# Altium footprint library iMag.PcbLib: 52 footprints (part 1 of 4)
Each footprint in its own frame and in the unit in brackets; x right, y up, seen from the top. Pads: shape width x height; smd on the part's side, far side on the other; paste and mask are expansions set on the pad; w line width, h text height; cw(c..) or ccw(c..) is an arc to the next point about the centre after c.
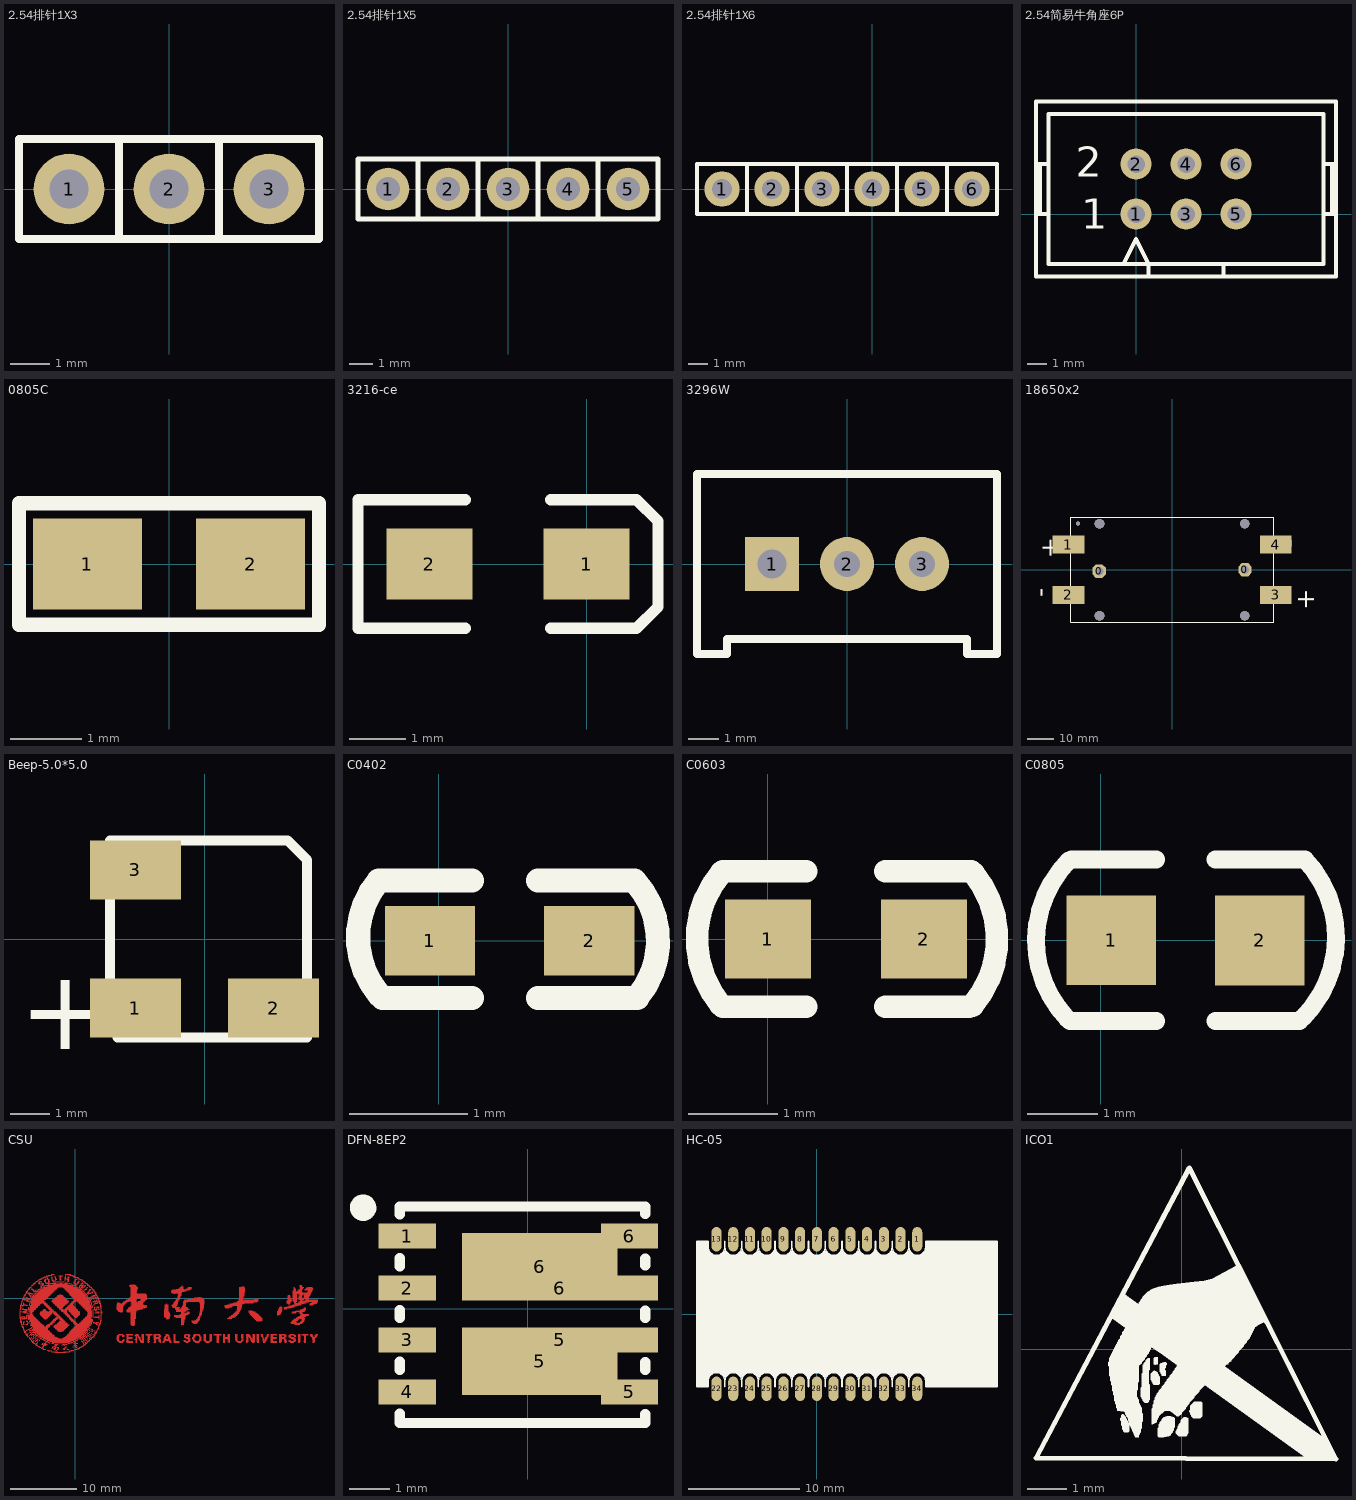
[diagram p0: the footprints below, top view; thin cyan lines are the x and y axes]

## 2.54排针1X3 [mm]
pads (3):
  round 1.8 hole 1: 1(-2.54,0) 2(0,0) 3(2.54,0)
Top Overlay:
  lines w0.2: -1.27,-1.27 -1.27,1.27 ; 1.27,-1.27 1.27,1.27 ; -3.81,-1.27 3.81,-1.27 3.81,1.27 -3.81,1.27 -3.81,-1.27
3D body "1001-3.STEP": height 2.5, standoff -9.04, extent -3.81,-1.27 3.81,1.27

## 2.54排针1X5 [mm]
pads (5):
  round 1.8 hole 1: 1(-5.08,0) 2(-2.54,0) 3(0,0) 4(2.54,0) 5(5.08,0)
Top Overlay:
  lines w0.2: -3.81,-1.27 -3.81,1.27 ; -1.27,-1.27 -1.27,1.27 ; 1.27,-1.27 1.27,1.27 ; 3.81,-1.27 3.81,1.27 ; -6.35,-1.27 -6.35,1.27 6.35,1.27 6.35,-1.27 -6.35,-1.27
3D body "1001-5.STEP": height 2.5, standoff -9.04, extent -6.35,-1.27 6.35,1.27

## 2.54排针1X6 [mm]
pads (6):
  round 1.8 hole 1: 1(-7.62,0) 2(-5.08,0) 3(-2.54,0) 4(0,0) 5(2.54,0) 6(5.08,0)
Top Overlay:
  lines w0.2: -6.35,-1.27 -6.35,1.27 ; -3.81,-1.27 -3.81,1.27 ; -1.27,-1.27 -1.27,1.27 ; 1.27,-1.27 1.27,1.27 ; 3.81,-1.27 3.81,1.27 ; -8.89,-1.27 6.35,-1.27 6.35,1.27 -8.89,1.27 -8.89,-1.27
3D body "1001-6.STEP": height 2.5, standoff -9.04, extent -8.89,-1.27 6.35,1.27

## 2.54简易牛角座6P [mil]
pads (6):
  round 62 hole 35: 1(0,0) 2(0,100) 3(100,0) 4(100,100) 5(200,0) 6(200,100)
Top Overlay:
  lines w8: -200,0 -175,0 ; -200,100 -175,100 ; -191.67,0 -191.67,100 ; -25,-100 0,-50 25,-100 ; 25,-125 25,-100 ; 125,-100 -175,-100 -175,200 375,200 375,-100 175,-100 ; 175,-125 175,-100 ; 375,0 400,0 ; 375,100 400,100 ; 391.67,0 391.67,100 ; 25,-100 175,-100 ; -200,-125 400,-125 400,225 -200,225 -200,-125
  text "1" at -110,-29 h60
  text "2" at -121,75 h60
3D body "User Library-IDC Socket Male 6pin Straight THT Goldplated 2_54mm.step": height 359.45, standoff -128.74, extent -199.61,-117.32 399.61,231.1

## 0805C [mil]
pads (2):
  rect 60x50 smd: 1(-45,0) 2(45,0)
Top Overlay:
  lines w7.87: -82.68,-33.46 -82.68,33.46 82.68,33.46 82.68,-33.46 -82.68,-33.46
3D body "User Library-cap_0805_lowprofile.step": height 37.4, standoff 0, extent -39.36,-23.62 39.37,23.63

## 3216-ce [mil]
pads (2):
  rect 60x50 smd: 1(0,0) 2(-110,0)
Top Overlay:
  lines w7.87: -85,-45 -160,-45 -160,45 -85,45 ; -25,-45 35,-45 50,-30 50,30 35,45 -25,45
3D body "User Library-AVX_ACASE.STEP": height 67.32, standoff 0, extent -121.93,-31.14 11.93,35

## 3296W [mm]
pads (3):
  rect 1.8x1.8 hole 0.95: 1(-2.5,0)
  round 1.8 hole 0.85: 2(0,0) 3(2.5,0)
Top Overlay:
  lines w0.254: -5,-3 -4,-3 -4,-2.5 4,-2.5 4,-3 5,-3 5,3 -5,3 -5,-3
3D body "User Library-3296W.step": height 11.55, standoff -1.6, extent -4.765,-2.4 4.765,2.4

## 18650x2 [mm] "2节电池座"
pads (6):
  oct 5.08x5.08 hole 3.2: 0(-27.7,-0.508) 0(27.7,0)
  rect 12x6.9 smd: 1(-39.35,9.55) 2(-39.35,-9.55) 3(39.35,-9.55) 4(39.35,9.55)
via 27.6,-17.5 diameter 3.7 hole 3.7
via 27.6,17.5 diameter 3.7 hole 3.7
via -35.687,17.526 diameter 1.6 hole 1.6
via -27.6,-17.5 diameter 3.7 hole 3.7
via -27.6,17.5 diameter 3.7 hole 3.7
Top Overlay:
  lines w0.3: -38.55,-19.95 38.55,-19.95 38.55,19.95 -38.55,19.95 -38.55,-19.95
  text "-" at -44.45,-10.541 h12
  text "-" at 50.292,8.255 h12
  text "+" at 45.466,-7.239 h12
  text "+" at -51.689,12.319 h12
3D body "User Library-Blossom 1048.STEP": height 15.03, standoff -1.38, extent -43.129,-19.888 42.875,19.888

## Beep-5.0*5.0 [mm]
pads (3):
  rect 2.3x1.5 smd: 1(-1.75,-1.75) 2(1.75,-1.75) 3(-1.75,1.75)
Top Overlay:
  lines w0.254: -2.4,-2.301 -2.4,2.499 2.101,2.499 2.6,2 2.6,-2.501 -2.2,-2.501
  text "+" at -4.699,-2.794 h2.03
3D body: height 2, standoff 0, extent -2.413,-2.54 2.667,2.54

## C0402 [mil]
pads (2):
  rect 30x23 smd: 1(-3,0) 2(50,0)
Top Overlay:
  lines w8: 11,-19 -18.77,-19 -19.99,-17.78 cw(c2.37,1.12) -20,20 11,20 ; 33,-19 65.95,-19 ; 33,20 65,20 cw(c43.58,0.05) 65.95,-18.84
3D body "cap_0402.STEP": height 19.68, standoff 0, extent 2.31,-10 41.69,9.69

## C0603 [mil]
pads (2):
  rect 38x35 smd: 1(0,0) 2(69,0)
Top Overlay:
  lines w10: -21,-29 cw(c14.45,-0.04) -20.48,29.56 ; -20,-30 17,-30 ; -20,30 17,30 ; 52,-30 89,-30 ; 52,30 90,30 ; 90.48,-29.56 ccw(c55.55,0.04) 91,29
3D body "User Library-0603 SMD Capacitor.STEP": height 11.89, standoff 0, extent 3.8,-15.8 66.8,15.7

## C0805 [mil]
pads (2):
  rect 50x50 smd: 1(6,0) 2(88.7,-0.1)
Top Overlay:
  lines w10: -18.66,-43.67 cw(c27.24,-0.08) -17.7,44.5 ; -17.2,-45 31,-45 ; -16.3,45 31,45 ; 64,-45 111,-45 ; 64,45 113.1,45 ; 112.92,-43.04 ccw(c67.98,1.54) 114,45
3D body "User Library-0805 SMD Capacitor.STEP": height 30.39, standoff -0.39, extent 7.93,-24.5 86.67,24.71

## CSU [mm] "校徽"
Top Layer:
  drawing of 1935 lines, arcs and shapes, not listed
Top Solder:
  drawing of 2060 lines, arcs and shapes, not listed
Bottom Solder:
  drawing of 2060 lines, arcs and shapes, not listed

## DFN-8EP2 [mil] "DFN-8_L5.5-W5.2-P1.27-LS6.0-BL-EP2"
pads (10):
  rect 55x24 smd: 1(-116,70) 2(-116,20) 3(-116,-30) 4(-116,-80) 5(98,-80) 6(98,70)
  rect 150x65 smd: 5(11.5,-50.5) 6(11.5,40.5)
  rect 189x24 smd: 5(31,-30) 6(31,20)
Top Overlay:
  lines w10: -123.1,-110 113.1,-110 113.1,-101.62 ; -123.1,-108.5 -123.1,-101.1 ; -123.1,-58.9 -123.1,-51.1 ; -123.1,-8.9 -123.1,-1.1 ; -123.1,41.1 -123.1,48.9 ; -123.1,91.1 -123.1,98.5 113.1,98.5 113.1,91.62 ; 113.1,-58.85 113.1,-51.46 ; 113.1,-8.7 113.1,-1.82 ; 113.1,41.97 113.1,48.34
  lines w15.7: -158.6,92.5 cw(c-158.55,97.4) -158.5,92.5
3D body "User Library-powerpak_so_8.step": height 44.09, standoff 0, extent -138.93,-116.29 118.95,96.3

## HC-05 [mm] "HC-05/06/08V15"
pads (26):
  oval 0.9x2.2 smd: 1(9,6.7) 2(7.5,6.7) 3(6,6.7) 4(4.5,6.7) 5(3,6.7) 6(1.5,6.7) 7(0,6.7) 8(-1.5,6.7) 9(-3,6.7) 10(-4.5,6.7) 11(-6,6.7) 12(-7.5,6.7) 13(-9,6.7) 22(-9,-6.7) 23(-7.5,-6.7) 24(-6,-6.7) 25(-4.5,-6.7) 26(-3,-6.7) 27(-1.5,-6.7) 28(0,-6.7) 29(1.5,-6.7) 30(3,-6.7) 31(4.5,-6.7) 32(6,-6.7) 33(7.5,-6.7) 34(9,-6.7)
Top Overlay:
  rectangle: -8.6,5.275 -7.9,5.425
  rectangle: -8.41,5.4 -8.09,5.66
  rectangle: -7.1,5.275 -6.4,5.425
  rectangle: -6.91,5.4 -6.59,5.66
  rectangle: -5.6,5.275 -4.9,5.425
  rectangle: -5.41,5.4 -5.09,5.66
  rectangle: -4.1,5.275 -3.4,5.425
  rectangle: -3.91,5.4 -3.59,5.66
  rectangle: -2.6,5.275 -1.9,5.425
  rectangle: -2.41,5.4 -2.09,5.66
  rectangle: -1.1,5.275 -0.4,5.425
  rectangle: -0.91,5.4 -0.59,5.66
  rectangle: 0.4,5.275 1.1,5.425
  rectangle: 0.59,5.4 0.91,5.66
  rectangle: 1.9,5.275 2.6,5.425
  rectangle: 2.09,5.4 2.41,5.66
  rectangle: 3.4,5.275 4.1,5.425
  rectangle: 3.59,5.4 3.91,5.66
  rectangle: 4.9,5.275 5.6,5.425
  rectangle: 5.09,5.4 5.41,5.66
  rectangle: 6.4,5.275 7.1,5.425
  rectangle: 6.59,5.4 6.91,5.66
  rectangle: 7.9,5.275 8.6,5.425
  rectangle: 8.09,5.4 8.41,5.66
  rectangle: 9.4,5.275 10.1,5.425
  rectangle: 9.59,5.4 9.91,5.66
  rectangle: -8.6,-5.425 -7.9,-5.275
  rectangle: -8.41,-5.66 -8.09,-5.4
  rectangle: -7.1,-5.425 -6.4,-5.275
  rectangle: -6.91,-5.66 -6.59,-5.4
  rectangle: -5.6,-5.425 -4.9,-5.275
  rectangle: -5.41,-5.66 -5.09,-5.4
  rectangle: -4.1,-5.425 -3.4,-5.275
  rectangle: -3.91,-5.66 -3.59,-5.4
  rectangle: -2.6,-5.425 -1.9,-5.275
  rectangle: -2.41,-5.66 -2.09,-5.4
  rectangle: -1.1,-5.425 -0.4,-5.275
  rectangle: -0.91,-5.66 -0.59,-5.4
  rectangle: 0.4,-5.425 1.1,-5.275
  rectangle: 0.59,-5.66 0.91,-5.4
  rectangle: 1.9,-5.425 2.6,-5.275
  rectangle: 2.09,-5.66 2.41,-5.4
  rectangle: 3.4,-5.425 4.1,-5.275
  rectangle: 3.59,-5.66 3.91,-5.4
  rectangle: 4.9,-5.425 5.6,-5.275
  rectangle: 5.09,-5.66 5.41,-5.4
  rectangle: 6.4,-5.425 7.1,-5.275
  rectangle: 6.59,-5.66 6.91,-5.4
  rectangle: 7.9,-5.425 8.6,-5.275
  rectangle: 8.09,-5.66 8.41,-5.4
  rectangle: 9.4,-5.425 10.1,-5.275
  rectangle: 9.59,-5.66 9.91,-5.4
  rectangle: -10.75,-6.5 -9.75,6.5
  rectangle: 9.75,-6.5 16.15,6.5
  rectangle: -9.75,-5.3 9.75,5.3
  rectangle: -9.75,5.3 -9.425,5.475
  rectangle: -9.75,5.475 -9.6,5.675
  rectangle: -9.75,-5.475 -9.425,-5.3
  rectangle: -9.75,-5.675 -9.6,-5.475
  lines w0.152: -8.25,-5.85 -8.25,-6.5 -8.25,-6 ; 9.75,-6 ccw(c9,-6) 8.25,-6 ccw(c7.5,-6) 6.75,-6 ccw(c6,-6) 5.25,-6 ccw(c4.5,-6) 3.75,-6 ccw(c3,-6) 2.25,-6 ccw(c1.5,-6) 0.75,-6 ccw(c0,-6) -0.75,-6 ccw(c-1.5,-6) -2.25,-6 ccw(c-3,-6) -3.75,-6 ccw(c-4.5,-6) -5.25,-6 ccw(c-6,-6) -6.75,-6 ccw(c-7.5,-6) -8.25,-6 ; 9.75,-5.85 9.75,-6.5 16.15,-6.5 16.15,6.5 9.75,6.5 9.75,6 cw(c9,6) 8.25,6 ; -8.25,-6 ccw(c-9,-6) -9.75,-6 -9.75,-6.5 -10.75,-6.5 -10.75,6.5 -9.75,6.5 -9.75,6 ccw(c-9,6) -8.25,6 ; -8.25,6 ccw(c-7.5,6) -6.75,6 ; -8.25,6 -8.25,6.5 -8.25,6 ; -6.75,6 ccw(c-6,6) -5.25,6 ; -6.75,6 -6.75,6.5 -6.75,6 ; -5.25,6 ccw(c-4.5,6) -3.75,6 ; -5.25,6 -5.25,6.5 -5.25,6 ; -3.75,6 ccw(c-3,6) -2.25,6 ; -3.75,6 -3.75,6.5 -3.75,6 ; -2.25,6 ccw(c-1.5,6) -0.75,6 ; -2.25,6 -2.25,6.5 -2.25,6 ; -0.75,6 ccw(c0,6) 0.75,6 ; -0.75,6 -0.75,6.5 -0.75,6 ; 0.75,6 ccw(c1.5,6) 2.25,6 ; 0.75,6 0.75,6.5 0.75,6 ; 2.25,6 ccw(c3,6) 3.75,6 ; 2.25,6 2.25,6.5 2.25,6 ; 3.75,6 ccw(c4.5,6) 5.25,6 ; 3.75,6 3.75,6.5 3.75,6 ; 5.25,6 ccw(c6,6) 6.75,6 ; 5.25,6 5.25,6.5 5.25,6 ; 6.75,6 ccw(c7.5,6) 8.25,6 ; 6.75,6 6.75,6.5 6.75,6 ; 8.25,6 8.25,6.5 8.25,6 ; -6.75,-6.5 -6.75,-5.85 -6.75,-6.5 ; -5.25,-6.5 -5.25,-5.85 -5.25,-6.5 ; -3.75,-6.5 -3.75,-5.85 -3.75,-6.5 ; -2.25,-6.5 -2.25,-5.85 -2.25,-6.5 ; -0.75,-6.5 -0.75,-5.85 -0.75,-6.5 ; 0.75,-6.5 0.75,-5.85 0.75,-6.5 ; 2.25,-6.5 2.25,-5.85 2.25,-6.5 ; 3.75,-6.5 3.75,-5.85 3.75,-6.5 ; 5.25,-6.5 5.25,-5.85 5.25,-6.5 ; 6.75,-6.5 6.75,-5.85 6.75,-6.5 ; 8.25,-6.5 8.25,-5.85 8.25,-6.5
3D body "User Library-HC05(06).step": height 4.31, standoff 0, extent -10.833,-6.5 16.167,6.5

## ICO1 [mm]
Top Overlay:
  drawing of 14 lines, arcs and shapes, not listed